# Altium schematic symbol library jlcpcb_2025_04_capacitors_extended_0805.schlib: 3281 symbols (part 1 of 18)
Pins are listed as number, name and electrical type; pins without a type are passive.

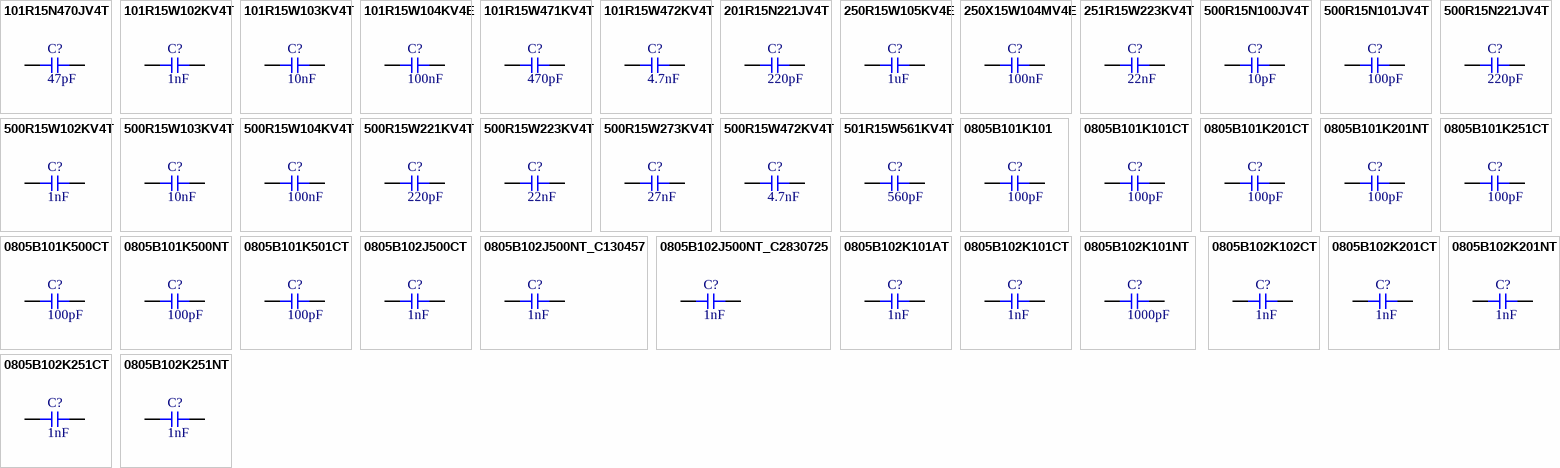
[diagram p0: symbols 101R15N470JV4T to 0805B102K251NT]

## 101R15N470JV4T
designator C?  Capacitance: 47pF  (hidden comment: *)
Capacitor, Ceramic (MLCC), 47pF, ±5%, 100V, NP0, ±5%, SMD 0805; Manufacturer: Johanson Dielectrics; Manufacturer Part Number: 101R15N470JV4T; Package Size: 0805; JLCPCB Basic Part: No; JLCPCB Part Number: C431651; Supplier 1: LCSC; Category: Capacitors - MLCC; Supplier Part Number 1: C431651; Tolerance: ±5%; Voltage Rating: 100V; Temperature Coefficient: NP0; RoHS: Yes; ComponentLink1Description: Datasheet; ComponentLink1URL: https://wmsc.lcsc.com/wmsc/upload/file/pdf/v2/lcsc/2304140030_Johanson-Dielectrics-101R15N470JV4T_C431651.pdf; ComponentLink2Description: JLCPCB Part URL; ComponentLink2URL: https://jlcpcb.com/partdetail/C431651; ComponentLink3Description: LCSC Part URL; ComponentLink3URL: https://lcsc.com/product-detail/Multilayer-Ceramic-Capacitors-MLCC---SMD-SMT_Johanson-Dielectrics-Johanson-Dielectrics-101R15N470JV4T_C431651.html
footprint CAP-0805 (0805 (2012M) Capacitor)
pins: 1, 2

## 101R15W102KV4T
designator C?  Capacitance: 1nF  (hidden comment: *)
Capacitor, Ceramic (MLCC), 1nF, ±10%, 100V, X7R, ±10%, SMD 0805; Manufacturer: Johanson Dielectrics; Manufacturer Part Number: 101R15W102KV4T; Package Size: 0805; JLCPCB Basic Part: No; JLCPCB Part Number: C431641; Supplier 1: LCSC; Category: Capacitors - MLCC; Supplier Part Number 1: C431641; Tolerance: ±10%; Voltage Rating: 100V; Temperature Coefficient: X7R; RoHS: Yes; ComponentLink1Description: Datasheet; ComponentLink1URL: https://wmsc.lcsc.com/wmsc/upload/file/pdf/v2/lcsc/2304140030_Johanson-Dielectrics-101R15W102KV4T_C431641.pdf; ComponentLink2Description: JLCPCB Part URL; ComponentLink2URL: https://jlcpcb.com/partdetail/C431641; ComponentLink3Description: LCSC Part URL; ComponentLink3URL: https://lcsc.com/product-detail/Multilayer-Ceramic-Capacitors-MLCC---SMD-SMT_Johanson-Dielectrics-Johanson-Dielectrics-101R15W102KV4T_C431641.html
footprint CAP-0805 (0805 (2012M) Capacitor)
pins: 1, 2

## 101R15W103KV4T
designator C?  Capacitance: 10nF  (hidden comment: *)
Capacitor, Ceramic (MLCC), 10nF, ±10%, 100V, X7R, ±10%, SMD 0805; Manufacturer: Johanson Dielectrics; Manufacturer Part Number: 101R15W103KV4T; Package Size: 0805; JLCPCB Basic Part: No; JLCPCB Part Number: C173254; Supplier 1: LCSC; Category: Capacitors - MLCC; Supplier Part Number 1: C173254; Tolerance: ±10%; Voltage Rating: 100V; Temperature Coefficient: X7R; RoHS: Yes; ComponentLink1Description: Datasheet; ComponentLink1URL: https://wmsc.lcsc.com/wmsc/upload/file/pdf/v2/lcsc/2304140030_Johanson-Dielectrics-101R15W103KV4T_C173254.pdf; ComponentLink2Description: JLCPCB Part URL; ComponentLink2URL: https://jlcpcb.com/partdetail/C173254; ComponentLink3Description: LCSC Part URL; ComponentLink3URL: https://lcsc.com/product-detail/Multilayer-Ceramic-Capacitors-MLCC---SMD-SMT_Johanson-Dielectrics-Johanson-Dielectrics-101R15W103KV4T_C173254.html
footprint CAP-0805 (0805 (2012M) Capacitor)
pins: 1, 2

## 101R15W104KV4E
designator C?  Capacitance: 100nF  (hidden comment: *)
Capacitor, Ceramic (MLCC), 100nF, ±10%, 100V, X7R, ±10%, SMD 0805; Manufacturer: Johanson Dielectrics; Manufacturer Part Number: 101R15W104KV4E; Package Size: 0805; JLCPCB Basic Part: No; JLCPCB Part Number: C431642; Supplier 1: LCSC; Category: Capacitors - MLCC; Supplier Part Number 1: C431642; Tolerance: ±10%; Voltage Rating: 100V; Temperature Coefficient: X7R; RoHS: Yes; ComponentLink1Description: Datasheet; ComponentLink1URL: https://wmsc.lcsc.com/wmsc/upload/file/pdf/v2/lcsc/2304140030_Johanson-Dielectrics-101R15W104KV4E_C431642.pdf; ComponentLink2Description: JLCPCB Part URL; ComponentLink2URL: https://jlcpcb.com/partdetail/C431642; ComponentLink3Description: LCSC Part URL; ComponentLink3URL: https://lcsc.com/product-detail/Multilayer-Ceramic-Capacitors-MLCC---SMD-SMT_Johanson-Dielectrics-Johanson-Dielectrics-101R15W104KV4E_C431642.html
footprint CAP-0805 (0805 (2012M) Capacitor)
pins: 1, 2

## 101R15W471KV4T
designator C?  Capacitance: 470pF  (hidden comment: *)
Capacitor, Ceramic (MLCC), 470pF, ±10%, 100V, X7R, ±10%, SMD 0805; Manufacturer: Johanson Dielectrics; Manufacturer Part Number: 101R15W471KV4T; Package Size: 0805; JLCPCB Basic Part: No; JLCPCB Part Number: C431652; Supplier 1: LCSC; Category: Capacitors - MLCC; Supplier Part Number 1: C431652; Tolerance: ±10%; Voltage Rating: 100V; Temperature Coefficient: X7R; RoHS: Yes; ComponentLink1Description: Datasheet; ComponentLink1URL: https://wmsc.lcsc.com/wmsc/upload/file/pdf/v2/lcsc/2304140030_Johanson-Dielectrics-101R15W471KV4T_C431652.pdf; ComponentLink2Description: JLCPCB Part URL; ComponentLink2URL: https://jlcpcb.com/partdetail/C431652; ComponentLink3Description: LCSC Part URL; ComponentLink3URL: https://lcsc.com/product-detail/Multilayer-Ceramic-Capacitors-MLCC---SMD-SMT_Johanson-Dielectrics-Johanson-Dielectrics-101R15W471KV4T_C431652.html
footprint CAP-0805 (0805 (2012M) Capacitor)
pins: 1, 2

## 101R15W472KV4T
designator C?  Capacitance: 4.7nF  (hidden comment: *)
Capacitor, Ceramic (MLCC), 4.7nF, ±10%, 100V, X7R, ±10%, SMD 0805; Manufacturer: Johanson Dielectrics; Manufacturer Part Number: 101R15W472KV4T; Package Size: 0805; JLCPCB Basic Part: No; JLCPCB Part Number: C431010; Supplier 1: LCSC; Category: Capacitors - MLCC; Supplier Part Number 1: C431010; Tolerance: ±10%; Voltage Rating: 100V; Temperature Coefficient: X7R; RoHS: Yes; ComponentLink1Description: Datasheet; ComponentLink1URL: https://wmsc.lcsc.com/wmsc/upload/file/pdf/v2/lcsc/2304140030_Johanson-Dielectrics-101R15W472KV4T_C431010.pdf; ComponentLink2Description: JLCPCB Part URL; ComponentLink2URL: https://jlcpcb.com/partdetail/C431010; ComponentLink3Description: LCSC Part URL; ComponentLink3URL: https://lcsc.com/product-detail/Multilayer-Ceramic-Capacitors-MLCC---SMD-SMT_Johanson-Dielectrics-Johanson-Dielectrics-101R15W472KV4T_C431010.html
footprint CAP-0805 (0805 (2012M) Capacitor)
pins: 1, 2

## 201R15N221JV4T
designator C?  Capacitance: 220pF  (hidden comment: *)
Capacitor, Ceramic (MLCC), 220pF, ±5%, 200V, NP0, ±5%, SMD 0805; Manufacturer: Johanson Dielectrics; Manufacturer Part Number: 201R15N221JV4T; Package Size: 0805; JLCPCB Basic Part: No; JLCPCB Part Number: C173241; Supplier 1: LCSC; Category: Capacitors - MLCC; Supplier Part Number 1: C173241; Tolerance: ±5%; Voltage Rating: 200V; Temperature Coefficient: NP0; RoHS: Yes; ComponentLink1Description: Datasheet; ComponentLink1URL: https://wmsc.lcsc.com/wmsc/upload/file/pdf/v2/lcsc/2111161730_Johanson-Dielectrics-201R15N221JV4T_C173241.pdf; ComponentLink2Description: JLCPCB Part URL; ComponentLink2URL: https://jlcpcb.com/partdetail/C173241; ComponentLink3Description: LCSC Part URL; ComponentLink3URL: https://lcsc.com/product-detail/Multilayer-Ceramic-Capacitors-MLCC---SMD-SMT_Johanson-Dielectrics-Johanson-Dielectrics-201R15N221JV4T_C173241.html
footprint CAP-0805 (0805 (2012M) Capacitor)
pins: 1, 2

## 250R15W105KV4E
designator C?  Capacitance: 1uF  (hidden comment: *)
Capacitor, Ceramic (MLCC), 1uF, ±10%, 25V, X7R, ±10%, SMD 0805; Manufacturer: Johanson Dielectrics; Manufacturer Part Number: 250R15W105KV4E; Package Size: 0805; JLCPCB Basic Part: No; JLCPCB Part Number: C430996; Supplier 1: LCSC; Category: Capacitors - MLCC; Supplier Part Number 1: C430996; Tolerance: ±10%; Voltage Rating: 25V; Temperature Coefficient: X7R; RoHS: Yes; ComponentLink1Description: Datasheet; ComponentLink1URL: https://wmsc.lcsc.com/wmsc/upload/file/pdf/v2/lcsc/2304140030_Johanson-Dielectrics-250R15W105KV4E_C430996.pdf; ComponentLink2Description: JLCPCB Part URL; ComponentLink2URL: https://jlcpcb.com/partdetail/C430996; ComponentLink3Description: LCSC Part URL; ComponentLink3URL: https://lcsc.com/product-detail/Multilayer-Ceramic-Capacitors-MLCC---SMD-SMT_Johanson-Dielectrics-Johanson-Dielectrics-250R15W105KV4E_C430996.html
footprint CAP-0805 (0805 (2012M) Capacitor)
pins: 1, 2

## 250X15W104MV4E
designator C?  Capacitance: 100nF  (hidden comment: *)
Capacitor, Ceramic (MLCC), 100nF, ±20%, 25V, X7R, ±20%, SMD 0805; Manufacturer: Johanson Dielectrics; Manufacturer Part Number: 250X15W104MV4E; Package Size: 0805; JLCPCB Basic Part: No; JLCPCB Part Number: C111274; Supplier 1: LCSC; Category: Capacitors - MLCC; Supplier Part Number 1: C111274; Tolerance: ±20%; Voltage Rating: 25V; Temperature Coefficient: X7R; RoHS: Yes; ComponentLink1Description: Datasheet; ComponentLink1URL: https://wmsc.lcsc.com/wmsc/upload/file/pdf/v2/lcsc/1809051229_Johanson-Dielectrics-250X15W104MV4E_C111274.pdf; ComponentLink2Description: JLCPCB Part URL; ComponentLink2URL: https://jlcpcb.com/partdetail/C111274; ComponentLink3Description: LCSC Part URL; ComponentLink3URL: https://lcsc.com/product-detail/Multilayer-Ceramic-Capacitors-MLCC---SMD-SMT_Johanson-Dielectrics-Johanson-Dielectrics-250X15W104MV4E_C111274.html
footprint CAP-0805 (0805 (2012M) Capacitor)
pins: 1, 2

## 251R15W223KV4T
designator C?  Capacitance: 22nF  (hidden comment: *)
Capacitor, Ceramic (MLCC), 22nF, ±10%, 250V, X7R, ±10%, SMD 0805; Manufacturer: Johanson Dielectrics; Manufacturer Part Number: 251R15W223KV4T; Package Size: 0805; JLCPCB Basic Part: No; JLCPCB Part Number: C2915778; Supplier 1: LCSC; Category: Capacitors - MLCC; Supplier Part Number 1: C2915778; Tolerance: ±10%; Voltage Rating: 250V; Temperature Coefficient: X7R; RoHS: Yes; ComponentLink1Description: Datasheet; ComponentLink1URL: https://wmsc.lcsc.com/wmsc/upload/file/pdf/v2/lcsc/2111161830_Johanson-Dielectrics-251R15W223KV4T_C2915778.pdf; ComponentLink2Description: JLCPCB Part URL; ComponentLink2URL: https://jlcpcb.com/partdetail/C2915778; ComponentLink3Description: LCSC Part URL; ComponentLink3URL: https://lcsc.com/product-detail/Multilayer-Ceramic-Capacitors-MLCC---SMD-SMT_Johanson-Dielectrics-Johanson-Dielectrics-251R15W223KV4T_C2915778.html
footprint CAP-0805 (0805 (2012M) Capacitor)
pins: 1, 2

## 500R15N100JV4T
designator C?  Capacitance: 10pF  (hidden comment: *)
Capacitor, Ceramic (MLCC), 10pF, ±5%, 50V, NP0, ±5%, SMD 0805; Manufacturer: Johanson Dielectrics; Manufacturer Part Number: 500R15N100JV4T; Package Size: 0805; JLCPCB Basic Part: No; JLCPCB Part Number: C2170514; Supplier 1: LCSC; Category: Capacitors - MLCC; Supplier Part Number 1: C2170514; Tolerance: ±5%; Voltage Rating: 50V; Temperature Coefficient: NP0; RoHS: Yes; ComponentLink1Description: Datasheet; ComponentLink1URL: https://wmsc.lcsc.com/wmsc/upload/file/pdf/v2/lcsc/2304140030_Johanson-Dielectrics-500R15N100JV4T_C2170514.pdf; ComponentLink2Description: JLCPCB Part URL; ComponentLink2URL: https://jlcpcb.com/partdetail/C2170514; ComponentLink3Description: LCSC Part URL; ComponentLink3URL: https://lcsc.com/product-detail/Multilayer-Ceramic-Capacitors-MLCC---SMD-SMT_Johanson-Dielectrics-Johanson-Dielectrics-500R15N100JV4T_C2170514.html
footprint CAP-0805 (0805 (2012M) Capacitor)
pins: 1, 2

## 500R15N101JV4T
designator C?  Capacitance: 100pF  (hidden comment: *)
Capacitor, Ceramic (MLCC), 100pF, ±5%, 50V, NP0, ±5%, SMD 0805; Manufacturer: Johanson Dielectrics; Manufacturer Part Number: 500R15N101JV4T; Package Size: 0805; JLCPCB Basic Part: No; JLCPCB Part Number: C167431; Supplier 1: LCSC; Category: Capacitors - MLCC; Supplier Part Number 1: C167431; Tolerance: ±5%; Voltage Rating: 50V; Temperature Coefficient: NP0; RoHS: Yes; ComponentLink1Description: Datasheet; ComponentLink1URL: https://wmsc.lcsc.com/wmsc/upload/file/pdf/v2/lcsc/2304140030_Johanson-Dielectrics-500R15N101JV4T_C167431.pdf; ComponentLink2Description: JLCPCB Part URL; ComponentLink2URL: https://jlcpcb.com/partdetail/C167431; ComponentLink3Description: LCSC Part URL; ComponentLink3URL: https://lcsc.com/product-detail/Multilayer-Ceramic-Capacitors-MLCC---SMD-SMT_Johanson-Dielectrics-Johanson-Dielectrics-500R15N101JV4T_C167431.html
footprint CAP-0805 (0805 (2012M) Capacitor)
pins: 1, 2

## 500R15N221JV4T
designator C?  Capacitance: 220pF  (hidden comment: *)
Capacitor, Ceramic (MLCC), 220pF, ±5%, 50V, C0G, ±5%, SMD 0805; Manufacturer: Johanson Dielectrics; Manufacturer Part Number: 500R15N221JV4T; Package Size: 0805; JLCPCB Basic Part: No; JLCPCB Part Number: C3883401; Supplier 1: LCSC; Category: Capacitors - MLCC; Supplier Part Number 1: C3883401; Tolerance: ±5%; Voltage Rating: 50V; Temperature Coefficient: C0G; RoHS: Yes; ComponentLink1Description: Datasheet; ComponentLink1URL: https://wmsc.lcsc.com/wmsc/upload/file/pdf/v2/lcsc/2401221508_Johanson-Dielectrics-500R15N221JV4T_C3883401.pdf; ComponentLink2Description: JLCPCB Part URL; ComponentLink2URL: https://jlcpcb.com/partdetail/C3883401; ComponentLink3Description: LCSC Part URL; ComponentLink3URL: https://lcsc.com/product-detail/Multilayer-Ceramic-Capacitors-MLCC---SMD-SMT_Johanson-Dielectrics-Johanson-Dielectrics-500R15N221JV4T_C3883401.html
footprint CAP-0805 (0805 (2012M) Capacitor)
pins: 1, 2

## 500R15W102KV4T
designator C?  Capacitance: 1nF  (hidden comment: *)
Capacitor, Ceramic (MLCC), 1nF, ±10%, 50V, X7R, ±10%, SMD 0805; Manufacturer: Johanson Dielectrics; Manufacturer Part Number: 500R15W102KV4T; Package Size: 0805; JLCPCB Basic Part: No; JLCPCB Part Number: C430994; Supplier 1: LCSC; Category: Capacitors - MLCC; Supplier Part Number 1: C430994; Tolerance: ±10%; Voltage Rating: 50V; Temperature Coefficient: X7R; RoHS: Yes; ComponentLink1Description: Datasheet; ComponentLink1URL: https://wmsc.lcsc.com/wmsc/upload/file/pdf/v2/lcsc/2304140030_Johanson-Dielectrics-500R15W102KV4T_C430994.pdf; ComponentLink2Description: JLCPCB Part URL; ComponentLink2URL: https://jlcpcb.com/partdetail/C430994; ComponentLink3Description: LCSC Part URL; ComponentLink3URL: https://lcsc.com/product-detail/Multilayer-Ceramic-Capacitors-MLCC---SMD-SMT_Johanson-Dielectrics-Johanson-Dielectrics-500R15W102KV4T_C430994.html
footprint CAP-0805 (0805 (2012M) Capacitor)
pins: 1, 2

## 500R15W103KV4T
designator C?  Capacitance: 10nF  (hidden comment: *)
Capacitor, Ceramic (MLCC), 10nF, ±10%, 50V, X7R, ±10%, SMD 0805; Manufacturer: Johanson Dielectrics; Manufacturer Part Number: 500R15W103KV4T; Package Size: 0805; JLCPCB Basic Part: No; JLCPCB Part Number: C173259; Supplier 1: LCSC; Category: Capacitors - MLCC; Supplier Part Number 1: C173259; Tolerance: ±10%; Voltage Rating: 50V; Temperature Coefficient: X7R; RoHS: Yes; ComponentLink1Description: Datasheet; ComponentLink1URL: https://wmsc.lcsc.com/wmsc/upload/file/pdf/v2/lcsc/2304140030_Johanson-Dielectrics-500R15W103KV4T_C173259.pdf; ComponentLink2Description: JLCPCB Part URL; ComponentLink2URL: https://jlcpcb.com/partdetail/C173259; ComponentLink3Description: LCSC Part URL; ComponentLink3URL: https://lcsc.com/product-detail/Multilayer-Ceramic-Capacitors-MLCC---SMD-SMT_Johanson-Dielectrics-Johanson-Dielectrics-500R15W103KV4T_C173259.html
footprint CAP-0805 (0805 (2012M) Capacitor)
pins: 1, 2

## 500R15W104KV4T
designator C?  Capacitance: 100nF  (hidden comment: *)
Capacitor, Ceramic (MLCC), 100nF, ±10%, 50V, X7R, ±10%, SMD 0805; Manufacturer: Johanson Dielectrics; Manufacturer Part Number: 500R15W104KV4T; Package Size: 0805; JLCPCB Basic Part: No; JLCPCB Part Number: C430995; Supplier 1: LCSC; Category: Capacitors - MLCC; Supplier Part Number 1: C430995; Tolerance: ±10%; Voltage Rating: 50V; Temperature Coefficient: X7R; RoHS: Yes; ComponentLink1Description: Datasheet; ComponentLink1URL: https://wmsc.lcsc.com/wmsc/upload/file/pdf/v2/lcsc/2304140030_Johanson-Dielectrics-500R15W104KV4T_C430995.pdf; ComponentLink2Description: JLCPCB Part URL; ComponentLink2URL: https://jlcpcb.com/partdetail/C430995; ComponentLink3Description: LCSC Part URL; ComponentLink3URL: https://lcsc.com/product-detail/Multilayer-Ceramic-Capacitors-MLCC---SMD-SMT_Johanson-Dielectrics-Johanson-Dielectrics-500R15W104KV4T_C430995.html
footprint CAP-0805 (0805 (2012M) Capacitor)
pins: 1, 2

## 500R15W221KV4T
designator C?  Capacitance: 220pF  (hidden comment: *)
Capacitor, Ceramic (MLCC), 220pF, ±10%, 50V, X7R, ±10%, SMD 0805; Manufacturer: Johanson Dielectrics; Manufacturer Part Number: 500R15W221KV4T; Package Size: 0805; JLCPCB Basic Part: No; JLCPCB Part Number: C431637; Supplier 1: LCSC; Category: Capacitors - MLCC; Supplier Part Number 1: C431637; Tolerance: ±10%; Voltage Rating: 50V; Temperature Coefficient: X7R; RoHS: Yes; ComponentLink1Description: Datasheet; ComponentLink1URL: https://wmsc.lcsc.com/wmsc/upload/file/pdf/v2/lcsc/2304140030_Johanson-Dielectrics-500R15W221KV4T_C431637.pdf; ComponentLink2Description: JLCPCB Part URL; ComponentLink2URL: https://jlcpcb.com/partdetail/C431637; ComponentLink3Description: LCSC Part URL; ComponentLink3URL: https://lcsc.com/product-detail/Multilayer-Ceramic-Capacitors-MLCC---SMD-SMT_Johanson-Dielectrics-Johanson-Dielectrics-500R15W221KV4T_C431637.html
footprint CAP-0805 (0805 (2012M) Capacitor)
pins: 1, 2

## 500R15W223KV4T
designator C?  Capacitance: 22nF  (hidden comment: *)
Capacitor, Ceramic (MLCC), 22nF, ±10%, 50V, X7R, ±10%, SMD 0805; Manufacturer: Johanson Dielectrics; Manufacturer Part Number: 500R15W223KV4T; Package Size: 0805; JLCPCB Basic Part: No; JLCPCB Part Number: C431636; Supplier 1: LCSC; Category: Capacitors - MLCC; Supplier Part Number 1: C431636; Tolerance: ±10%; Voltage Rating: 50V; Temperature Coefficient: X7R; RoHS: Yes; ComponentLink1Description: Datasheet; ComponentLink1URL: https://wmsc.lcsc.com/wmsc/upload/file/pdf/v2/lcsc/2304140030_Johanson-Dielectrics-500R15W223KV4T_C431636.pdf; ComponentLink2Description: JLCPCB Part URL; ComponentLink2URL: https://jlcpcb.com/partdetail/C431636; ComponentLink3Description: LCSC Part URL; ComponentLink3URL: https://lcsc.com/product-detail/Multilayer-Ceramic-Capacitors-MLCC---SMD-SMT_Johanson-Dielectrics-Johanson-Dielectrics-500R15W223KV4T_C431636.html
footprint CAP-0805 (0805 (2012M) Capacitor)
pins: 1, 2

## 500R15W273KV4T
designator C?  Capacitance: 27nF  (hidden comment: *)
Capacitor, Ceramic (MLCC), 27nF, ±10%, 50V, X7R, ±10%, SMD 0805; Manufacturer: Johanson Dielectrics; Manufacturer Part Number: 500R15W273KV4T; Package Size: 0805; JLCPCB Basic Part: No; JLCPCB Part Number: C431004; Supplier 1: LCSC; Category: Capacitors - MLCC; Supplier Part Number 1: C431004; Tolerance: ±10%; Voltage Rating: 50V; Temperature Coefficient: X7R; RoHS: Yes; ComponentLink1Description: Datasheet; ComponentLink1URL: https://wmsc.lcsc.com/wmsc/upload/file/pdf/v2/lcsc/2304140030_Johanson-Dielectrics-500R15W273KV4T_C431004.pdf; ComponentLink2Description: JLCPCB Part URL; ComponentLink2URL: https://jlcpcb.com/partdetail/C431004; ComponentLink3Description: LCSC Part URL; ComponentLink3URL: https://lcsc.com/product-detail/Multilayer-Ceramic-Capacitors-MLCC---SMD-SMT_Johanson-Dielectrics-Johanson-Dielectrics-500R15W273KV4T_C431004.html
footprint CAP-0805 (0805 (2012M) Capacitor)
pins: 1, 2

## 500R15W472KV4T
designator C?  Capacitance: 4.7nF  (hidden comment: *)
Capacitor, Ceramic (MLCC), 4.7nF, ±10%, 50V, X7R, ±10%, SMD 0805; Manufacturer: Johanson Dielectrics; Manufacturer Part Number: 500R15W472KV4T; Package Size: 0805; JLCPCB Basic Part: No; JLCPCB Part Number: C431001; Supplier 1: LCSC; Category: Capacitors - MLCC; Supplier Part Number 1: C431001; Tolerance: ±10%; Voltage Rating: 50V; Temperature Coefficient: X7R; RoHS: Yes; ComponentLink1Description: Datasheet; ComponentLink1URL: https://wmsc.lcsc.com/wmsc/upload/file/pdf/v2/lcsc/2304140030_Johanson-Dielectrics-500R15W472KV4T_C431001.pdf; ComponentLink2Description: JLCPCB Part URL; ComponentLink2URL: https://jlcpcb.com/partdetail/C431001; ComponentLink3Description: LCSC Part URL; ComponentLink3URL: https://lcsc.com/product-detail/Multilayer-Ceramic-Capacitors-MLCC---SMD-SMT_Johanson-Dielectrics-Johanson-Dielectrics-500R15W472KV4T_C431001.html
footprint CAP-0805 (0805 (2012M) Capacitor)
pins: 1, 2

## 501R15W561KV4T
designator C?  Capacitance: 560pF  (hidden comment: *)
Capacitor, Ceramic (MLCC), 560pF, ±10%, 500V, X7R, ±10%, SMD 0805; Manufacturer: Johanson Dielectrics; Manufacturer Part Number: 501R15W561KV4T; Package Size: 0805; JLCPCB Basic Part: No; JLCPCB Part Number: C2917767; Supplier 1: LCSC; Category: Capacitors - MLCC; Supplier Part Number 1: C2917767; Tolerance: ±10%; Voltage Rating: 500V; Temperature Coefficient: X7R; RoHS: Yes; ComponentLink1Description: Datasheet; ComponentLink1URL: https://wmsc.lcsc.com/wmsc/upload/file/pdf/v2/lcsc/2205250916_Johanson-Dielectrics-501R15W561KV4T_C2917767.pdf; ComponentLink2Description: JLCPCB Part URL; ComponentLink2URL: https://jlcpcb.com/partdetail/C2917767; ComponentLink3Description: LCSC Part URL; ComponentLink3URL: https://lcsc.com/product-detail/Multilayer-Ceramic-Capacitors-MLCC---SMD-SMT_Johanson-Dielectrics-Johanson-Dielectrics-501R15W561KV4T_C2917767.html
footprint CAP-0805 (0805 (2012M) Capacitor)
pins: 1, 2

## 0805B101K101
designator C?  Capacitance: 100pF  (hidden comment: *)
Capacitor, Ceramic (MLCC), 100pF, ±10%, 100V, X7R, ±10%, SMD 0805; Manufacturer: Walsin Tech Corp; Manufacturer Part Number: 0805B101K101; Package Size: 0805; JLCPCB Basic Part: No; JLCPCB Part Number: C152894; Supplier 1: LCSC; Category: Capacitors - MLCC; Supplier Part Number 1: C152894; Tolerance: ±10%; Voltage Rating: 100V; Temperature Coefficient: X7R; RoHS: Yes; ComponentLink1Description: Datasheet; ComponentLink1URL: https://wmsc.lcsc.com/wmsc/upload/file/pdf/v2/lcsc/2304140030_Walsin-Tech-Corp-0805B101K101_C152894.pdf; ComponentLink2Description: JLCPCB Part URL; ComponentLink2URL: https://jlcpcb.com/partdetail/C152894; ComponentLink3Description: LCSC Part URL; ComponentLink3URL: https://lcsc.com/product-detail/Multilayer-Ceramic-Capacitors-MLCC---SMD-SMT_Walsin-Tech-Corp-Walsin-Tech-Corp-0805B101K101_C152894.html
footprint CAP-0805 (0805 (2012M) Capacitor)
pins: 1, 2

## 0805B101K101CT
designator C?  Capacitance: 100pF  (hidden comment: *)
Capacitor, Ceramic (MLCC), 100pF, ±10%, 100V, X7R, ±10%, SMD 0805; Manufacturer: Walsin Tech Corp; Manufacturer Part Number: 0805B101K101CT; Package Size: 0805; JLCPCB Basic Part: No; JLCPCB Part Number: C2909417; Supplier 1: LCSC; Category: Capacitors - MLCC; Supplier Part Number 1: C2909417; Tolerance: ±10%; Voltage Rating: 100V; Temperature Coefficient: X7R; RoHS: Yes; ComponentLink1Description: Datasheet; ComponentLink1URL: https://wmsc.lcsc.com/wmsc/upload/file/pdf/v2/lcsc/2110272130_Walsin-Tech-Corp-0805B101K101CT_C2909417.pdf; ComponentLink2Description: JLCPCB Part URL; ComponentLink2URL: https://jlcpcb.com/partdetail/C2909417; ComponentLink3Description: LCSC Part URL; ComponentLink3URL: https://lcsc.com/product-detail/Multilayer-Ceramic-Capacitors-MLCC---SMD-SMT_Walsin-Tech-Corp-Walsin-Tech-Corp-0805B101K101CT_C2909417.html
footprint CAP-0805 (0805 (2012M) Capacitor)
pins: 1, 2

## 0805B101K201CT
designator C?  Capacitance: 100pF  (hidden comment: *)
Capacitor, Ceramic (MLCC), 100pF, ±10%, 200V, X7R, ±10%, SMD 0805; Manufacturer: Walsin Tech Corp; Manufacturer Part Number: 0805B101K201CT; Package Size: 0805; JLCPCB Basic Part: No; JLCPCB Part Number: C152893; Supplier 1: LCSC; Category: Capacitors - MLCC; Supplier Part Number 1: C152893; Tolerance: ±10%; Voltage Rating: 200V; Temperature Coefficient: X7R; RoHS: Yes; ComponentLink1Description: Datasheet; ComponentLink1URL: https://wmsc.lcsc.com/wmsc/upload/file/pdf/v2/lcsc/2304140030_Walsin-Tech-Corp-0805B101K201CT_C152893.pdf; ComponentLink2Description: JLCPCB Part URL; ComponentLink2URL: https://jlcpcb.com/partdetail/C152893; ComponentLink3Description: LCSC Part URL; ComponentLink3URL: https://lcsc.com/product-detail/Multilayer-Ceramic-Capacitors-MLCC---SMD-SMT_Walsin-Tech-Corp-Walsin-Tech-Corp-0805B101K201CT_C152893.html
footprint CAP-0805 (0805 (2012M) Capacitor)
pins: 1, 2

## 0805B101K201NT
designator C?  Capacitance: 100pF  (hidden comment: *)
Capacitor, Ceramic (MLCC), 100pF, ±10%, 200V, X7R, ±10%, SMD 0805; Manufacturer: FH (Guangdong Fenghua Advanced Tech); Manufacturer Part Number: 0805B101K201NT; Package Size: 0805; JLCPCB Basic Part: No; JLCPCB Part Number: C2991562; Supplier 1: LCSC; Category: Capacitors - MLCC; Supplier Part Number 1: C2991562; Tolerance: ±10%; Voltage Rating: 200V; Temperature Coefficient: X7R; RoHS: Yes; ComponentLink1Description: Datasheet; ComponentLink1URL: https://wmsc.lcsc.com/wmsc/upload/file/pdf/v2/lcsc/2204111630_FH--Guangdong-Fenghua-Advanced-Tech-0805B101K201NT_C2991562.pdf; ComponentLink2Description: JLCPCB Part URL; ComponentLink2URL: https://jlcpcb.com/partdetail/C2991562; ComponentLink3Description: LCSC Part URL; ComponentLink3URL: https://lcsc.com/product-detail/Multilayer-Ceramic-Capacitors-MLCC---SMD-SMT_FH-Guangdong-Fenghua-Advanced-Tech-FH-Guangdong-Fenghua-Advanced-Tech-0805B101K201NT_C2991562.html
footprint CAP-0805 (0805 (2012M) Capacitor)
pins: 1, 2

## 0805B101K251CT
designator C?  Capacitance: 100pF  (hidden comment: *)
Capacitor, Ceramic (MLCC), 100pF, ±10%, X7R, ±10%, SMD 0805; Manufacturer: Walsin Tech Corp; Manufacturer Part Number: 0805B101K251CT; Package Size: 0805; JLCPCB Basic Part: No; JLCPCB Part Number: C4354963; Supplier 1: LCSC; Category: Capacitors - MLCC; Supplier Part Number 1: C4354963; Tolerance: ±10%; Temperature Coefficient: X7R; RoHS: Yes; ComponentLink1Description: Datasheet; ComponentLink1URL: https://wmsc.lcsc.com/wmsc/upload/file/pdf/v2/lcsc/2207131800_Walsin-Tech-Corp-0805B101K251CT_C4354963.pdf; ComponentLink2Description: JLCPCB Part URL; ComponentLink2URL: https://jlcpcb.com/partdetail/C4354963; ComponentLink3Description: LCSC Part URL; ComponentLink3URL: https://lcsc.com/product-detail/Multilayer-Ceramic-Capacitors-MLCC---SMD-SMT_Walsin-Tech-Corp-Walsin-Tech-Corp-0805B101K251CT_C4354963.html
footprint CAP-0805 (0805 (2012M) Capacitor)
pins: 1, 2

## 0805B101K500CT
designator C?  Capacitance: 100pF  (hidden comment: *)
Capacitor, Ceramic (MLCC), 100pF, ±10%, 50V, X7R, ±10%, SMD 0805; Manufacturer: Walsin Tech Corp; Manufacturer Part Number: 0805B101K500CT; Package Size: 0805; JLCPCB Basic Part: No; JLCPCB Part Number: C152892; Supplier 1: LCSC; Category: Capacitors - MLCC; Supplier Part Number 1: C152892; Tolerance: ±10%; Voltage Rating: 50V; Temperature Coefficient: X7R; RoHS: Yes; ComponentLink1Description: Datasheet; ComponentLink1URL: https://wmsc.lcsc.com/wmsc/upload/file/pdf/v2/lcsc/2304140030_Walsin-Tech-Corp-0805B101K500CT_C152892.pdf; ComponentLink2Description: JLCPCB Part URL; ComponentLink2URL: https://jlcpcb.com/partdetail/C152892; ComponentLink3Description: LCSC Part URL; ComponentLink3URL: https://lcsc.com/product-detail/Multilayer-Ceramic-Capacitors-MLCC---SMD-SMT_Walsin-Tech-Corp-Walsin-Tech-Corp-0805B101K500CT_C152892.html
footprint CAP-0805 (0805 (2012M) Capacitor)
pins: 1, 2

## 0805B101K500NT
designator C?  Capacitance: 100pF  (hidden comment: *)
Capacitor, Ceramic (MLCC), 100pF, ±10%, 50V, ±10%, SMD 0805; Manufacturer: FH (Guangdong Fenghua Advanced Tech); Manufacturer Part Number: 0805B101K500NT; Package Size: 0805; JLCPCB Basic Part: No; JLCPCB Part Number: C2838744; Supplier 1: LCSC; Category: Capacitors - MLCC; Supplier Part Number 1: C2838744; Tolerance: ±10%; Voltage Rating: 50V; RoHS: Yes; ComponentLink1Description: Datasheet; ComponentLink1URL: https://wmsc.lcsc.com/wmsc/upload/file/pdf/v2/lcsc/2202131930_FH--Guangdong-Fenghua-Advanced-Tech-0805B101K500NT_C2838744.pdf; ComponentLink2Description: JLCPCB Part URL; ComponentLink2URL: https://jlcpcb.com/partdetail/C2838744; ComponentLink3Description: LCSC Part URL; ComponentLink3URL: https://lcsc.com/product-detail/Multilayer-Ceramic-Capacitors-MLCC---SMD-SMT_FH-Guangdong-Fenghua-Advanced-Tech-FH-Guangdong-Fenghua-Advanced-Tech-0805B101K500NT_C2838744.html
footprint CAP-0805 (0805 (2012M) Capacitor)
pins: 1, 2

## 0805B101K501CT
designator C?  Capacitance: 100pF  (hidden comment: *)
Capacitor, Ceramic (MLCC), 100pF, ±10%, 500V, X7R, ±10%, SMD 0805; Manufacturer: Walsin Tech Corp; Manufacturer Part Number: 0805B101K501CT; Package Size: 0805; JLCPCB Basic Part: No; JLCPCB Part Number: C396715; Supplier 1: LCSC; Category: Capacitors - MLCC; Supplier Part Number 1: C396715; Tolerance: ±10%; Voltage Rating: 500V; Temperature Coefficient: X7R; RoHS: Yes; ComponentLink1Description: Datasheet; ComponentLink1URL: https://wmsc.lcsc.com/wmsc/upload/file/pdf/v2/lcsc/2304140030_Walsin-Tech-Corp-0805B101K501CT_C396715.pdf; ComponentLink2Description: JLCPCB Part URL; ComponentLink2URL: https://jlcpcb.com/partdetail/C396715; ComponentLink3Description: LCSC Part URL; ComponentLink3URL: https://lcsc.com/product-detail/Multilayer-Ceramic-Capacitors-MLCC---SMD-SMT_Walsin-Tech-Corp-Walsin-Tech-Corp-0805B101K501CT_C396715.html
footprint CAP-0805 (0805 (2012M) Capacitor)
pins: 1, 2

## 0805B102J500CT
designator C?  Capacitance: 1nF  (hidden comment: *)
Capacitor, Ceramic (MLCC), 1nF, ±5%, 50V, X7R, ±5%, SMD 0805; Manufacturer: Walsin Tech Corp; Manufacturer Part Number: 0805B102J500CT; Package Size: 0805; JLCPCB Basic Part: No; JLCPCB Part Number: C458918; Supplier 1: LCSC; Category: Capacitors - MLCC; Supplier Part Number 1: C458918; Tolerance: ±5%; Voltage Rating: 50V; Temperature Coefficient: X7R; RoHS: Yes; ComponentLink1Description: Datasheet; ComponentLink1URL: https://wmsc.lcsc.com/wmsc/upload/file/pdf/v2/lcsc/2304140030_Walsin-Tech-Corp-0805B102J500CT_C458918.pdf; ComponentLink2Description: JLCPCB Part URL; ComponentLink2URL: https://jlcpcb.com/partdetail/C458918; ComponentLink3Description: LCSC Part URL; ComponentLink3URL: https://lcsc.com/product-detail/Multilayer-Ceramic-Capacitors-MLCC---SMD-SMT_Walsin-Tech-Corp-Walsin-Tech-Corp-0805B102J500CT_C458918.html
footprint CAP-0805 (0805 (2012M) Capacitor)
pins: 1, 2

## 0805B102J500NT_C130457
designator C?  Capacitance: 1nF  (hidden comment: *)
Capacitor, Ceramic (MLCC), 1nF, ±5%, 50V, X7R, ±5%, SMD 0805; Manufacturer: FH(Guangdong Fenghua Advanced Tech); Manufacturer Part Number: 0805B102J500NT; Package Size: 0805; JLCPCB Basic Part: No; JLCPCB Part Number: C130457; Supplier 1: LCSC; Category: Capacitors - MLCC; Supplier Part Number 1: C130457; Tolerance: ±5%; Voltage Rating: 50V; Temperature Coefficient: X7R; RoHS: Yes; ComponentLink1Description: Datasheet; ComponentLink1URL: https://wmsc.lcsc.com/wmsc/upload/file/pdf/v2/lcsc/2304140030_FH--Guangdong-Fenghua-Advanced-Tech-0805B102J500NT_C130457.pdf; ComponentLink2Description: JLCPCB Part URL; ComponentLink2URL: https://jlcpcb.com/partdetail/C130457; ComponentLink3Description: LCSC Part URL; ComponentLink3URL: https://lcsc.com/product-detail/Multilayer-Ceramic-Capacitors-MLCC---SMD-SMT_FH-Guangdong-Fenghua-Advanced-Tech-FH-Guangdong-Fenghua-Advanced-Tech-0805B102J500NT_C130457.html
footprint CAP-0805 (0805 (2012M) Capacitor)
pins: 1, 2

## 0805B102J500NT_C2830725
designator C?  Capacitance: 1nF  (hidden comment: *)
Capacitor, Ceramic (MLCC), 1nF, ±5%, 50V, ±5%, SMD 0805; Manufacturer: FH-BK(Guangdong Fenghua Bangke Elec); Manufacturer Part Number: 0805B102J500NT; Package Size: 0805; JLCPCB Basic Part: No; JLCPCB Part Number: C2830725; Supplier 1: LCSC; Category: Capacitors - MLCC; Supplier Part Number 1: C2830725; Tolerance: ±5%; Voltage Rating: 50V; RoHS: Yes; ComponentLink1Description: Datasheet; ComponentLink1URL: https://wmsc.lcsc.com/wmsc/upload/file/pdf/v2/lcsc/2105241611_FH-BK-Guangdong-Fenghua-Bangke-Elec-0805B102J500NT_C2830725.pdf; ComponentLink2Description: JLCPCB Part URL; ComponentLink2URL: https://jlcpcb.com/partdetail/C2830725; ComponentLink3Description: LCSC Part URL; ComponentLink3URL: https://lcsc.com/product-detail/Multilayer-Ceramic-Capacitors-MLCC---SMD-SMT_FH-BKGuangdong-Fenghua-Bangke-Elec-FH-BKGuangdong-Fenghua-Bangke-Elec-0805B102J500NT_C2830725.html
footprint CAP-0805 (0805 (2012M) Capacitor)
pins: 1, 2

## 0805B102K101AT
designator C?  Capacitance: 1nF  (hidden comment: *)
Capacitor, Ceramic (MLCC), 1nF, ±10%, 100V, X7R, ±10%, SMD 0805; Manufacturer: FH(Guangdong Fenghua Advanced Tech); Manufacturer Part Number: 0805B102K101AT; Package Size: 0805; JLCPCB Basic Part: No; JLCPCB Part Number: C880397; Supplier 1: LCSC; Category: Capacitors - MLCC; Supplier Part Number 1: C880397; Tolerance: ±10%; Voltage Rating: 100V; Temperature Coefficient: X7R; RoHS: Yes; ComponentLink1Description: Datasheet; ComponentLink1URL: https://wmsc.lcsc.com/wmsc/upload/file/pdf/v2/lcsc/2304140030_FH--Guangdong-Fenghua-Advanced-Tech-0805B102K101AT_C880397.pdf; ComponentLink2Description: JLCPCB Part URL; ComponentLink2URL: https://jlcpcb.com/partdetail/C880397; ComponentLink3Description: LCSC Part URL; ComponentLink3URL: https://lcsc.com/product-detail/Multilayer-Ceramic-Capacitors-MLCC---SMD-SMT_FH-Guangdong-Fenghua-Advanced-Tech-FH-Guangdong-Fenghua-Advanced-Tech-0805B102K101AT_C880397.html
footprint CAP-0805 (0805 (2012M) Capacitor)
pins: 1, 2

## 0805B102K101CT
designator C?  Capacitance: 1nF  (hidden comment: *)
Capacitor, Ceramic (MLCC), 1nF, ±10%, 100V, X7R, ±10%, SMD 0805; Manufacturer: Walsin Tech Corp; Manufacturer Part Number: 0805B102K101CT; Package Size: 0805; JLCPCB Basic Part: No; JLCPCB Part Number: C77448; Supplier 1: LCSC; Category: Capacitors - MLCC; Supplier Part Number 1: C77448; Tolerance: ±10%; Voltage Rating: 100V; Temperature Coefficient: X7R; RoHS: Yes; ComponentLink1Description: Datasheet; ComponentLink1URL: https://wmsc.lcsc.com/wmsc/upload/file/pdf/v2/lcsc/2304140030_Walsin-Tech-Corp-0805B102K101CT_C77448.pdf; ComponentLink2Description: JLCPCB Part URL; ComponentLink2URL: https://jlcpcb.com/partdetail/C77448; ComponentLink3Description: LCSC Part URL; ComponentLink3URL: https://lcsc.com/product-detail/Multilayer-Ceramic-Capacitors-MLCC---SMD-SMT_Walsin-Tech-Corp-Walsin-Tech-Corp-0805B102K101CT_C77448.html
footprint CAP-0805 (0805 (2012M) Capacitor)
pins: 1, 2

## 0805B102K101NT
designator C?  Capacitance: 1000pF  (hidden comment: *)
Capacitor, Ceramic (MLCC), 1000pF, ±10%, 100V, X7R, ±10%, SMD 0805; Manufacturer: FH (Guangdong Fenghua Advanced Tech); Manufacturer Part Number: 0805B102K101NT; Package Size: 0805; JLCPCB Basic Part: No; JLCPCB Part Number: C285098; Supplier 1: LCSC; Category: Capacitors - MLCC; Supplier Part Number 1: C285098; Tolerance: ±10%; Voltage Rating: 100V; Temperature Coefficient: X7R; RoHS: Yes; ComponentLink1Description: Datasheet; ComponentLink2Description: JLCPCB Part URL; ComponentLink2URL: https://jlcpcb.com/partdetail/C285098; ComponentLink3Description: LCSC Part URL; ComponentLink3URL: https://lcsc.com/product-detail/Multilayer-Ceramic-Capacitors-MLCC---SMD-SMT_FH-Guangdong-Fenghua-Advanced-Tech-FH-Guangdong-Fenghua-Advanced-Tech-0805B102K101NT_C285098.html
footprint CAP-0805 (0805 (2012M) Capacitor)
pins: 1, 2

## 0805B102K102CT
designator C?  Capacitance: 1nF  (hidden comment: *)
Capacitor, Ceramic (MLCC), 1nF, ±10%, 1kV, X7R, ±10%, SMD 0805; Manufacturer: Walsin Tech Corp; Manufacturer Part Number: 0805B102K102CT; Package Size: 0805; JLCPCB Basic Part: No; JLCPCB Part Number: C303890; Supplier 1: LCSC; Category: Capacitors - MLCC; Supplier Part Number 1: C303890; Tolerance: ±10%; Voltage Rating: 1kV; Temperature Coefficient: X7R; RoHS: Yes; ComponentLink1Description: Datasheet; ComponentLink2Description: JLCPCB Part URL; ComponentLink2URL: https://jlcpcb.com/partdetail/C303890; ComponentLink3Description: LCSC Part URL; ComponentLink3URL: https://lcsc.com/product-detail/Multilayer-Ceramic-Capacitors-MLCC---SMD-SMT_Walsin-Tech-Corp-Walsin-Tech-Corp-0805B102K102CT_C303890.html
footprint CAP-0805 (0805 (2012M) Capacitor)
pins: 1, 2

## 0805B102K201CT
designator C?  Capacitance: 1nF  (hidden comment: *)
Capacitor, Ceramic (MLCC), 1nF, ±10%, 200V, X7R, ±10%, SMD 0805; Manufacturer: Walsin Tech Corp; Manufacturer Part Number: 0805B102K201CT; Package Size: 0805; JLCPCB Basic Part: No; JLCPCB Part Number: C77449; Supplier 1: LCSC; Category: Capacitors - MLCC; Supplier Part Number 1: C77449; Tolerance: ±10%; Voltage Rating: 200V; Temperature Coefficient: X7R; RoHS: Yes; ComponentLink1Description: Datasheet; ComponentLink1URL: https://wmsc.lcsc.com/wmsc/upload/file/pdf/v2/lcsc/2304140030_Walsin-Tech-Corp-0805B102K201CT_C77449.pdf; ComponentLink2Description: JLCPCB Part URL; ComponentLink2URL: https://jlcpcb.com/partdetail/C77449; ComponentLink3Description: LCSC Part URL; ComponentLink3URL: https://lcsc.com/product-detail/Multilayer-Ceramic-Capacitors-MLCC---SMD-SMT_Walsin-Tech-Corp-Walsin-Tech-Corp-0805B102K201CT_C77449.html
footprint CAP-0805 (0805 (2012M) Capacitor)
pins: 1, 2

## 0805B102K201NT
designator C?  Capacitance: 1nF  (hidden comment: *)
Capacitor, Ceramic (MLCC), 1nF, ±10%, 200V, X7R, ±10%, SMD 0805; Manufacturer: FH(Guangdong Fenghua Advanced Tech); Manufacturer Part Number: 0805B102K201NT; Package Size: 0805; JLCPCB Basic Part: No; JLCPCB Part Number: C26912; Supplier 1: LCSC; Category: Capacitors - MLCC; Supplier Part Number 1: C26912; Tolerance: ±10%; Voltage Rating: 200V; Temperature Coefficient: X7R; RoHS: Yes; ComponentLink1Description: Datasheet; ComponentLink1URL: https://wmsc.lcsc.com/wmsc/upload/file/pdf/v2/lcsc/2304140030_FH--Guangdong-Fenghua-Advanced-Tech-0805B102K201NT_C26912.pdf; ComponentLink2Description: JLCPCB Part URL; ComponentLink2URL: https://jlcpcb.com/partdetail/C26912; ComponentLink3Description: LCSC Part URL; ComponentLink3URL: https://lcsc.com/product-detail/Multilayer-Ceramic-Capacitors-MLCC---SMD-SMT_FH-Guangdong-Fenghua-Advanced-Tech-FH-Guangdong-Fenghua-Advanced-Tech-0805B102K201NT_C26912.html
footprint CAP-0805 (0805 (2012M) Capacitor)
pins: 1, 2

## 0805B102K251CT
designator C?  Capacitance: 1nF  (hidden comment: *)
Capacitor, Ceramic (MLCC), 1nF, ±10%, 250V, X7R, ±10%, SMD 0805; Manufacturer: Walsin Tech Corp; Manufacturer Part Number: 0805B102K251CT; Package Size: 0805; JLCPCB Basic Part: No; JLCPCB Part Number: C338122; Supplier 1: LCSC; Category: Capacitors - MLCC; Supplier Part Number 1: C338122; Tolerance: ±10%; Voltage Rating: 250V; Temperature Coefficient: X7R; RoHS: Yes; ComponentLink1Description: Datasheet; ComponentLink1URL: https://wmsc.lcsc.com/wmsc/upload/file/pdf/v2/lcsc/2304140030_Walsin-Tech-Corp-0805B102K251CT_C338122.pdf; ComponentLink2Description: JLCPCB Part URL; ComponentLink2URL: https://jlcpcb.com/partdetail/C338122; ComponentLink3Description: LCSC Part URL; ComponentLink3URL: https://lcsc.com/product-detail/Multilayer-Ceramic-Capacitors-MLCC---SMD-SMT_Walsin-Tech-Corp-Walsin-Tech-Corp-0805B102K251CT_C338122.html
footprint CAP-0805 (0805 (2012M) Capacitor)
pins: 1, 2

## 0805B102K251NT
designator C?  Capacitance: 1nF  (hidden comment: *)
Capacitor, Ceramic (MLCC), 1nF, ±10%, 250V, X7R, ±10%, SMD 0805; Manufacturer: FH(Guangdong Fenghua Advanced Tech); Manufacturer Part Number: 0805B102K251NT; Package Size: 0805; JLCPCB Basic Part: No; JLCPCB Part Number: C285058; Supplier 1: LCSC; Category: Capacitors - MLCC; Supplier Part Number 1: C285058; Tolerance: ±10%; Voltage Rating: 250V; Temperature Coefficient: X7R; RoHS: Yes; ComponentLink1Description: Datasheet; ComponentLink1URL: https://wmsc.lcsc.com/wmsc/upload/file/pdf/v2/lcsc/2304140030_FH--Guangdong-Fenghua-Advanced-Tech-0805B102K251NT_C285058.pdf; ComponentLink2Description: JLCPCB Part URL; ComponentLink2URL: https://jlcpcb.com/partdetail/C285058; ComponentLink3Description: LCSC Part URL; ComponentLink3URL: https://lcsc.com/product-detail/Multilayer-Ceramic-Capacitors-MLCC---SMD-SMT_FH-Guangdong-Fenghua-Advanced-Tech-FH-Guangdong-Fenghua-Advanced-Tech-0805B102K251NT_C285058.html
footprint CAP-0805 (0805 (2012M) Capacitor)
pins: 1, 2

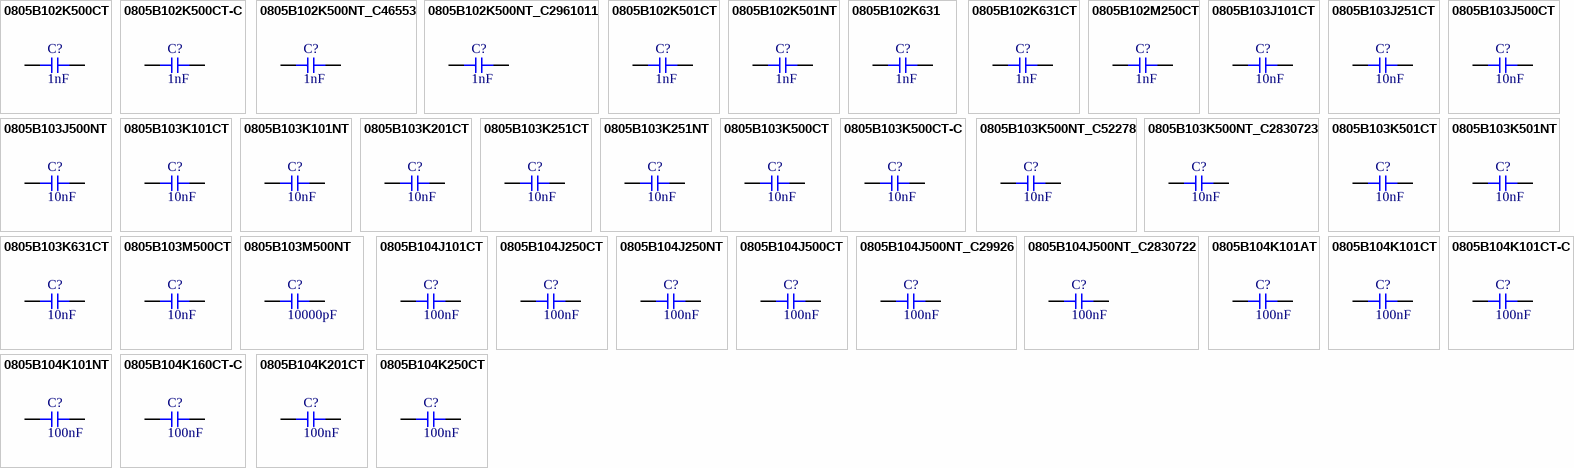
[diagram p1: symbols 0805B102K500CT to 0805B104K250CT]

## 0805B102K500CT
designator C?  Capacitance: 1nF  (hidden comment: *)
Capacitor, Ceramic (MLCC), 1nF, ±10%, 50V, X7R, ±10%, SMD 0805; Manufacturer: Walsin Tech Corp; Manufacturer Part Number: 0805B102K500CT; Package Size: 0805; JLCPCB Basic Part: No; JLCPCB Part Number: C303891; Supplier 1: LCSC; Category: Capacitors - MLCC; Supplier Part Number 1: C303891; Tolerance: ±10%; Voltage Rating: 50V; Temperature Coefficient: X7R; RoHS: Yes; ComponentLink1Description: Datasheet; ComponentLink1URL: https://wmsc.lcsc.com/wmsc/upload/file/pdf/v2/lcsc/2304140030_Walsin-Tech-Corp-0805B102K500CT_C303891.pdf; ComponentLink2Description: JLCPCB Part URL; ComponentLink2URL: https://jlcpcb.com/partdetail/C303891; ComponentLink3Description: LCSC Part URL; ComponentLink3URL: https://lcsc.com/product-detail/Multilayer-Ceramic-Capacitors-MLCC---SMD-SMT_Walsin-Tech-Corp-Walsin-Tech-Corp-0805B102K500CT_C303891.html
footprint CAP-0805 (0805 (2012M) Capacitor)
pins: 1, 2

## 0805B102K500CT-C
designator C?  Capacitance: 1nF  (hidden comment: *)
Capacitor, Ceramic (MLCC), 1nF, ±10%, 50V, X7R, ±10%, SMD 0805; Manufacturer: Walsin Tech Corp; Manufacturer Part Number: 0805B102K500CT-C; Package Size: 0805; JLCPCB Basic Part: No; JLCPCB Part Number: C2991439; Supplier 1: LCSC; Category: Capacitors - MLCC; Supplier Part Number 1: C2991439; Tolerance: ±10%; Voltage Rating: 50V; Temperature Coefficient: X7R; RoHS: Yes; ComponentLink1Description: Datasheet; ComponentLink1URL: https://wmsc.lcsc.com/wmsc/upload/file/pdf/v2/lcsc/2204131745_Walsin-Tech-Corp-0805B102K500CT-C_C2991439.pdf; ComponentLink2Description: JLCPCB Part URL; ComponentLink2URL: https://jlcpcb.com/partdetail/C2991439; ComponentLink3Description: LCSC Part URL; ComponentLink3URL: https://lcsc.com/product-detail/Multilayer-Ceramic-Capacitors-MLCC---SMD-SMT_Walsin-Tech-Corp-Walsin-Tech-Corp-0805B102K500CT-C_C2991439.html
footprint CAP-0805 (0805 (2012M) Capacitor)
pins: 1, 2
